# Altium footprint library FS_Footprints.PcbLib: 134 footprints (part 2 of 9)
Each footprint in its own frame and in the unit in brackets; x right, y up, seen from the top. Pads: shape width x height; smd on the part's side, far side on the other; paste and mask are expansions set on the pad; w line width, h text height; cw(c..) or ccw(c..) is an arc to the next point about the centre after c.
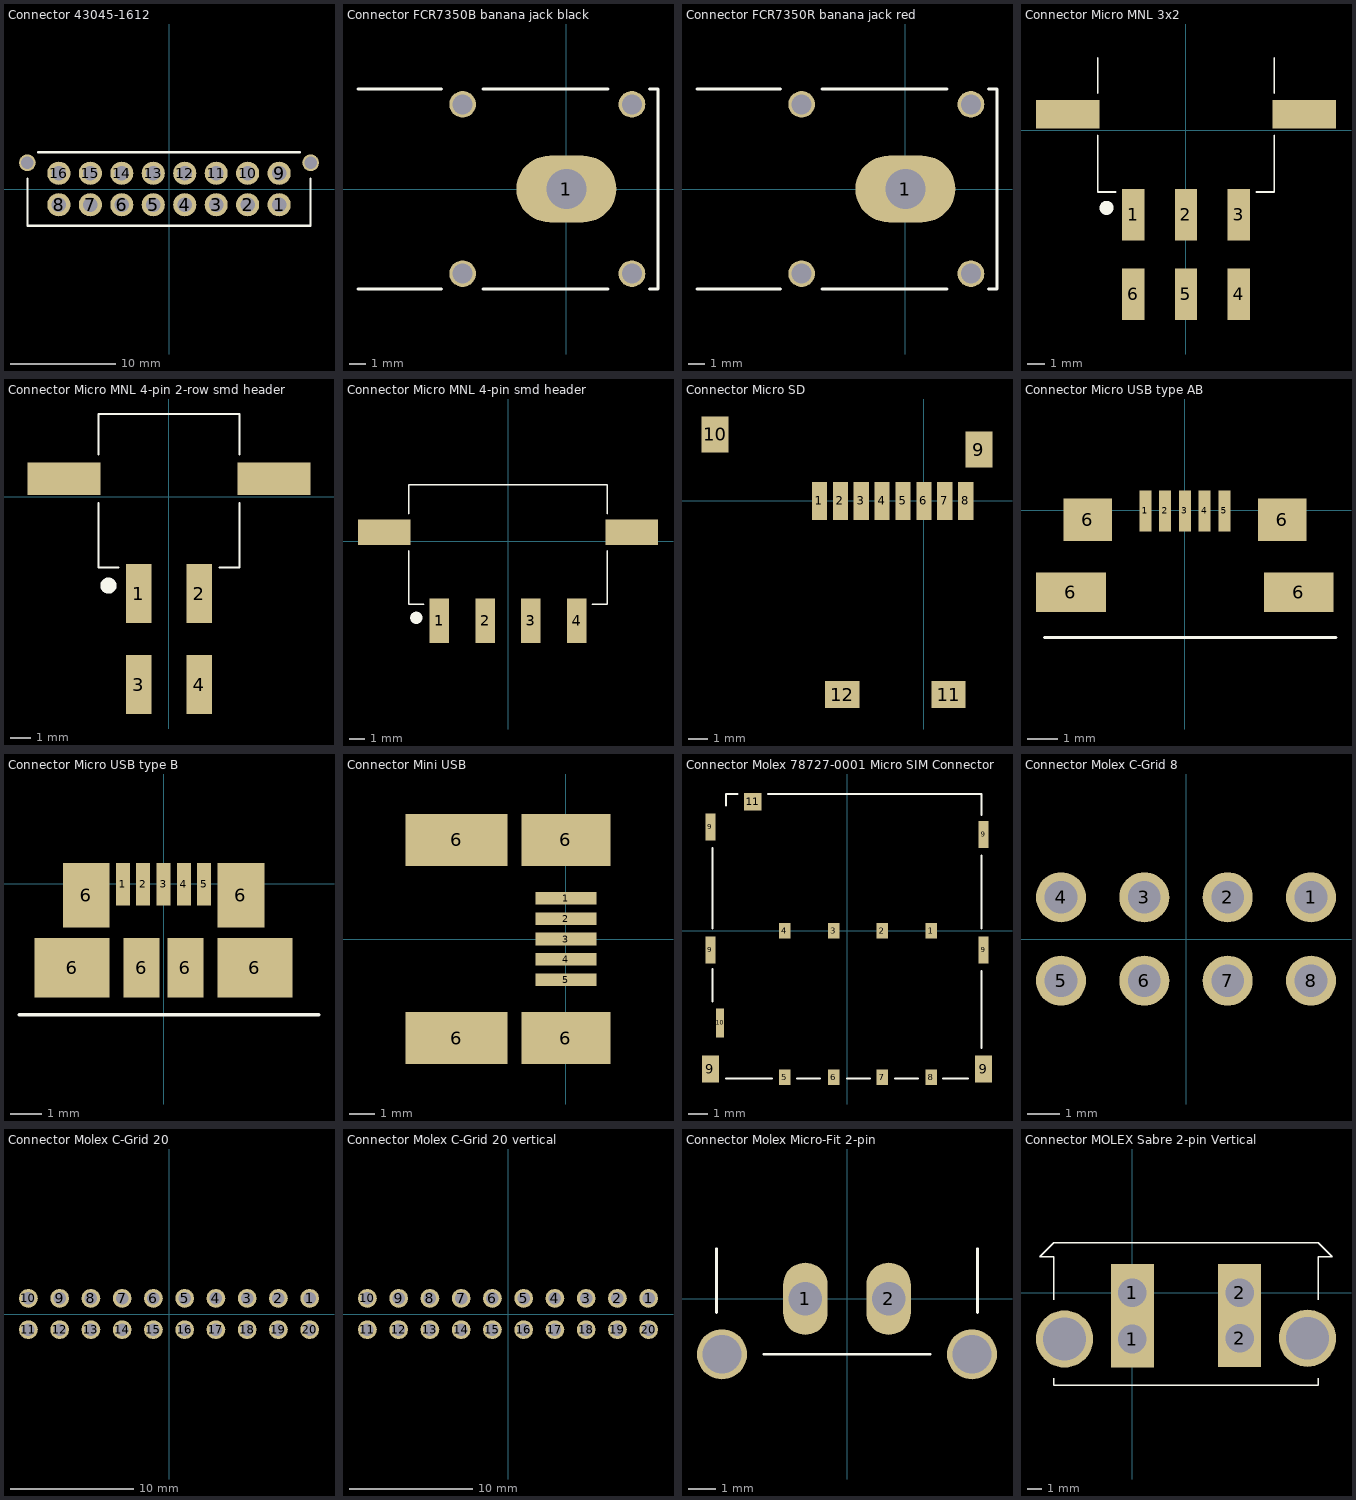
[diagram p1: the footprints below, top view; thin cyan lines are the x and y axes]

## Connector 43045-1612 [mm] "Molex Micro-Fit 16-way 2-row vertical header"
pads (18):
  round 2.2 hole 1.4: 1(10.5,-1.5) 2(7.5,-1.5) 3(4.5,-1.5) 4(1.5,-1.5) 5(-1.5,-1.5) 6(-4.5,-1.5) 7(-7.5,-1.5) 8(-10.5,-1.5) 9(10.5,1.5) 10(7.5,1.5) 11(4.5,1.5) 12(1.5,1.5) 13(-1.5,1.5) 14(-4.5,1.5) 15(-7.5,1.5) 16(-10.5,1.5)
  round 1.6 hole 1.2: ""(-13.5,2.5) ""(13.5,2.5)
Top Overlay:
  lines w0.2: -13.5,1 -13.5,-3.5 13.5,-3.5 13.5,1 ; -12.5,3.5 12.5,3.5
3D body "430451612.stp": height 9.95, standoff -3.14, extent -14.075,-3.97 14.075,4.8

## Connector FCR7350B banana jack black [mm]
pads (5):
  oval 6x4 hole 2.4: 1(0,0)
  rrect100% 1.6x1.6 hole 1.2: ""(-6.223,-5.08) ""(-6.223,5.08) ""(3.937,-5.08) ""(3.937,5.08)
Top Overlay:
  lines w0.2: -12.5,-6 -7.5,-6 ; -12.5,6 -7.5,6 ; -5,-6 2.5,-6 ; -5,6 2.5,6 ; 5,-6 5.5,-6 5.5,6 5,6
3D body "bananablk.stp": height 12.3, standoff -2.7, extent -27.412,-6 5.588,6

## Connector FCR7350R banana jack red [mm]
pads (5):
  oval 6x4 hole 2.4: 1(0,0)
  rrect100% 1.6x1.6 hole 1.2: ""(-6.223,-5.08) ""(-6.223,5.08) ""(3.937,-5.08) ""(3.937,5.08)
Top Overlay:
  lines w0.2: -12.5,-6 -7.5,-6 ; -12.5,6 -7.5,6 ; -5,-6 2.5,-6 ; -5,6 2.5,6 ; 5,-6 5.5,-6 5.5,6 5,6
3D body "bananared.stp": height 12.3, standoff -2.7, extent -27.412,-6 5.588,6

## Connector Micro MNL 3x2 [mm] "3-794627-6 smd right angle"
pads (8):
  rect 1.27x2.92 smd: 1(-3,-4.8) 2(0,-4.8) 3(3,-4.8) 4(3,-9.3) 5(0,-9.3) 6(-3,-9.3)
  rect 3.6x1.6 smd: ""(-6.7,0.9) ""(6.7,0.9)
Top Overlay:
  circle w0.4: c-4.5,-4.4 r0.2
  lines w0.1: -5,-0.3 -5,-3.5 -4,-3.5 ; -5,2.1 -5,4.1 ; 4,-3.5 5,-3.5 5,-0.3 ; 5,2.1 5,4.1
3D body "c-3-794627-6-j-3d.stp": height 8.68, standoff 0.01, extent -8.055,-10.13 8.055,5.5

## Connector Micro MNL 4-pin 2-row smd header [mm] "3-794629-4"
pads (6):
  rect 1.27x2.92 smd: 1(-1.5,-4.8) 2(1.5,-4.8) 3(-1.5,-9.3) 4(1.5,-9.3)
  rect 3.6x1.6 smd: ""(-5.2,0.9) ""(5.2,0.9)
Top Overlay:
  circle w0.4: c-3,-4.4 r0.2
  lines w0.1: -3.5,-0.3 -3.5,-3.5 -2.5,-3.5 ; -3.5,2.1 -3.5,4.1 3.5,4.1 3.5,2.1 ; 2.5,-3.5 3.5,-3.5 3.5,-0.3
3D body "c-3-794629-4-j-3d.stp": height 8.63, standoff -0.04, extent -6.52,-10.13 6.52,5.5

## Connector Micro MNL 4-pin smd header [mm] "2-1445057-4"
pads (6):
  rect 1.27x2.92 smd: 1(-4.5,-5.2) 2(-1.5,-5.2) 3(1.5,-5.2) 4(4.5,-5.2)
  rect 3.43x1.65 smd: ""(-8.1,0.6) ""(8.1,0.6)
Top Overlay:
  circle w0.4: c-6,-5 r0.2
  lines w0.1: -6.5,-0.6 -6.5,-4.1 -5.5,-4.1 ; -6.5,1.8 -6.5,3.7 -6.3,3.7 6.3,3.7 6.5,3.7 6.5,1.8 ; 5.5,-4.1 6.5,-4.1 6.5,-0.6
3D body "c-2-1445057-4-d-3d.stp": height 5.63, standoff -0.04, extent -9.625,-6 9.625,5.16

## Connector Micro SD [mm]
pads (12):
  rect 0.8x2 smd: 1(-5.5,0) 2(-4.4,0) 3(-3.3,0) 4(-2.2,0) 5(-1.1,0) 6(0,0) 7(1.1,0) 8(2.2,0)
  rect 1.4x1.9 smd: 9(2.9,2.7) 10(-11,3.5)
  rect 1.8x1.4 smd: 11(1.3,-10.2) 12(-4.3,-10.2)
3D body "User Library-micro sd soket.step": height 1.91, standoff 0.19, extent -10.4,-11.8 4.2,4.2

## Connector Micro USB type AB [mm]
pads (9):
  rect 0.4x1.35 smd: 1(-1.3,-0.025) 2(-0.65,-0.025) 3(0,-0.025) 4(0.65,-0.025) 5(1.3,-0.025)
  rect 2.3x1.3 smd: 6(-3.75,-2.7) 6(3.75,-2.7)
  rect 1.6x1.4 smd: 6(-3.2,-0.325) 6(3.2,-0.325)
Top Overlay:
  lines w0.1: -4.625,-4.2 4.975,-4.2
3D body "c-1981584-1-f-3d.stp": height 2.78, standoff -0.28, extent -4.4,-5.469 4.4,0.131

## Connector Micro USB type B [mm]
pads (11):
  rect 0.45x1.35 smd: 1(-1.3,-0.025) 2(-0.65,-0.025) 3(0,-0.025) 4(0.65,-0.025) 5(1.3,-0.025)
  rect 2.4x1.9 smd: 6(-2.925,-2.7) 6(2.925,-2.7)
  rect 1.5x2.05 smd: 6(-2.475,-0.375) 6(2.475,-0.375)
  rect 1.15x1.9 smd: 6(-0.7,-2.7) 6(0.7,-2.7)
Top Overlay:
  lines w0.1: -4.625,-4.2 4.975,-4.2
3D body "473460001.stp": height 2.71, standoff -0.23, extent -3.99,-4.85 3.99,0.58

## Connector Mini USB [mm]
pads (9):
  rect 2.4x0.5 smd: 1(0,1.6) 2(0,0.8) 3(0,0) 4(0,-0.8) 5(0,-1.6)
  rect 4x2.05 smd: 6(-4.3,-3.9) 6(-4.3,3.9)
  rect 3.5x2.05 smd: 6(0,-3.9) 6(0,3.9)
3D body "USB mini.stp": height 3.9, standoff -0.05, extent -8.3,-4.95 0.7,4.95

## Connector Molex 78727-0001 Micro SIM Connector [mm]
pads (16):
  rect 0.6x0.8 smd: 1(4.38,0) 2(1.84,0) 3(-0.7,0) 4(-3.24,0) 5(-3.24,-7.62) 6(-0.7,-7.62) 7(1.84,-7.62) 8(4.38,-7.62)
  rect 0.9x1.4 smd: 9(-7.1,-7.2) 9(7.1,-7.2)
  rect 0.5x1.4 smd: 9(-7.1,-1) 9(-7.1,5.4) 9(7.1,-1) 9(7.1,5)
  rect 0.4x1.5 smd: 10(-6.6,-4.8)
  rect 0.9x0.9 smd: 11(-4.9,6.7)
Top Overlay:
  lines w0.1: -7,-3.7 -7,-2 ; -7,0.1 -7,4.3 ; -6.3,-7.7 -3.9,-7.7 ; -6.3,6.5 -6.3,7.1 -5.7,7.1 ; -4.1,7.1 7,7.1 7,6 ; -2.6,-7.7 -1.4,-7.7 ; 0,-7.7 1.2,-7.7 ; 2.5,-7.7 3.7,-7.7 ; 5,-7.7 6.3,-7.7 ; 7,-6.1 7,-2.1 ; 7,0.1 7,3.9
3D body "787270001.stp": height 1.4, standoff 0, extent -7.24,-7.835 7.29,7.385

## Connector Molex C-Grid 8 [mil]
pads (8):
  round 60 hole 39.37: 1(150,50) 2(50,50) 3(-50,50) 4(-150,50) 5(-150,-50) 6(-50,-50) 7(50,-50) 8(150,-50)
3D body "901301208.stp": height 431.1, standoff -112.2, extent -246.06,-191.93 246.06,191.93

## Connector Molex C-Grid 20 [mil]
pads (20):
  round 60 hole 39.37: 1(450,50) 2(350,50) 3(250,50) 4(150,50) 5(50,50) 6(-50,50) 7(-150,50) 8(-250,50) 9(-350,50) 10(-450,50) 11(-450,-50) 12(-350,-50) 13(-250,-50) 14(-150,-50) 15(-50,-50) 16(50,-50) 17(150,-50) 18(250,-50) 19(350,-50) 20(450,-50)
3D body "901303220.stp": height 388.78, standoff -109.25, extent -546.06,-462.68 546.06,65

## Connector Molex C-Grid 20 vertical [mil]
pads (20):
  round 60 hole 39.37: 1(450,50) 2(350,50) 3(250,50) 4(150,50) 5(50,50) 6(-50,50) 7(-150,50) 8(-250,50) 9(-350,50) 10(-450,50) 11(-450,-50) 12(-350,-50) 13(-250,-50) 14(-150,-50) 15(-50,-50) 16(50,-50) 17(150,-50) 18(250,-50) 19(350,-50) 20(450,-50)
3D body "901301220.stp": height 431.1, standoff -112.2, extent -546.06,-191.93 546.07,191.93

## Connector Molex Micro-Fit 2-pin [mm] "Vertical header 3mm pitch 600VDC 5A  43650-0215"
pads (4):
  rrect100% 1.6x2.6 hole 1.2: 1(-1.5,0) 2(1.5,0)
  rrect100% 1.8x1.8 hole 1.4 paste+0: ""(-4.5,-2) ""(4.5,-2)
Top Overlay:
  lines w0.1: -4.7,-0.5 -4.7,1.8 ; -3,-2 3,-2 ; 4.7,-0.5 4.7,1.8
3D body "436500215.stp": height 9.95, standoff -3.13, extent -4.825,-2.47 4.825,3.135

## Connector MOLEX Sabre 2-pin Vertical [mm]
pads (6):
  rect 3x4 hole 2: 1(0,-3.25) 1(0,0) 2(7.5,-3.2) 2(7.5,0)
  round 4 hole 3: ""(-4.75,-3.25) ""(12.25,-3.2)
Top Overlay:
  lines w0.1: -5.5,-6 -5.5,-6.5 13,-6.5 13,-6 ; -5.5,-0.5 -5.5,2.5 -6.5,2.5 -5.5,3.5 13,3.5 14,2.5 13,2.5 13,-0.5
3D body "431600102.stp": height 14.78, standoff -3.79, extent -6.791,-9.62 14.291,3.766